# Altium footprint library ACTION_Others.pcblib: 88 footprints (part 4 of 6)
Each footprint in its own frame and in the unit in brackets; x right, y up, seen from the top. Pads: shape width x height; smd on the part's side, far side on the other; paste and mask are expansions set on the pad; w line width, h text height; cw(c..) or ccw(c..) is an arc to the next point about the centre after c.
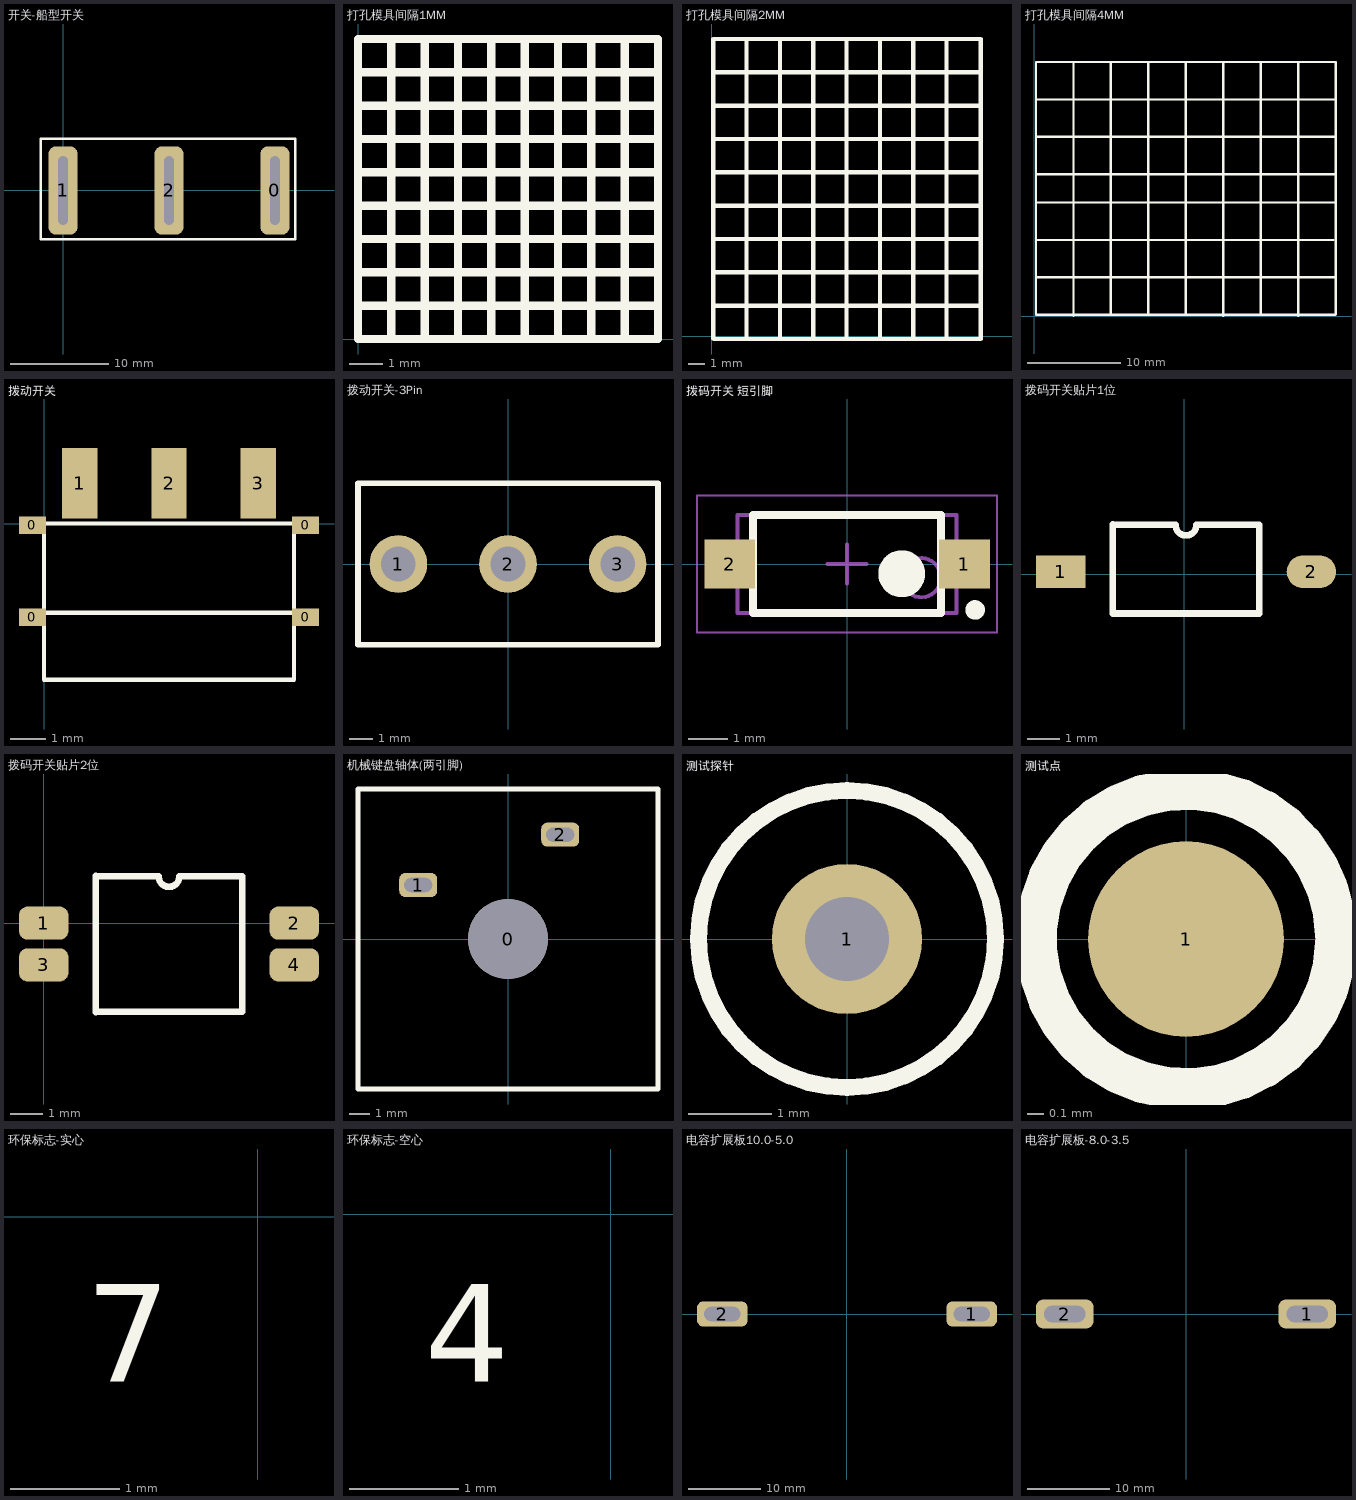
[diagram p3: the footprints below, top view; thin cyan lines are the x and y axes]

## 开关-船型开关 [mm]
pads (3):
  rrect50% 3x9 hole 7 slot 1 at 0 deg: 0(21.65,0) 1(0,0) 2(10.825,0)
Top Overlay:
  lines w0.254: -2.286,-5.004 23.714,-5.004 ; -2.286,-4.991 -2.286,5.309 ; -2.276,5.309 23.724,5.309 ; 23.724,-5.004 23.724,5.296

## 打孔模具间隔1MM [mm]
Top Overlay:
  lines w0.254: 0,1 9,1 ; 0,2 9,2 ; 0,3 9,3 ; 0,4 9,4 ; 0,5 9,5 ; 0,6 9,6 ; 0,7 9,7 ; 0,8 9,8 ; 1,0 1,9 ; 2,0 2,9 ; 3,0 3,9 ; 4,0 4,9 ; 5,0 5,9 ; 6,0 6,9 ; 7,0 7,9 ; 8,0 8,9 ; 0,0 9,0 9,9 0,9 0,0

## 打孔模具间隔2MM [mm]
Top Overlay:
  lines w0.254: 0.076,1.845 16.027,1.845 ; 0.076,3.845 16.104,3.845 ; 0.076,5.845 16.027,5.845 ; 0.076,7.845 16.002,7.845 ; 0.076,9.845 16.104,9.845 ; 0.076,11.845 16.078,11.845 ; 0.076,13.845 16.053,13.845 ; 0.076,15.845 16.053,15.845 ; 2.076,-0.076 2.076,17.845 ; 4.076,-0.127 4.076,17.845 ; 6.076,-0.076 6.076,17.845 ; 8.076,-0.076 8.076,17.845 ; 10.076,0 10.076,17.845 ; 12.076,-0.076 12.076,17.845 ; 14.076,-0.127 14.076,17.845 ; 0.076,-0.127 0.105,-0.155 16.129,-0.155 16.129,17.845 0.076,17.845 0.076,-0.127

## 打孔模具间隔4MM [mm]
Top Overlay:
  lines w0.254: 0.178,0.169 32.131,0.169 ; 0.178,0.178 0.178,27.169 32.055,27.169 ; 0.178,4.169 32.207,4.169 ; 0.178,8.169 31.902,8.169 ; 0.178,12.169 32.055,12.169 ; 0.178,15.169 32.055,15.169 ; 0.178,19.169 32.131,19.169 ; 0.178,23.169 32.131,23.169 ; 4.178,0.051 4.178,27.169 ; 8.178,0.305 8.178,27.169 ; 12.178,0.178 12.178,27.169 ; 16.178,0.406 16.178,27.169 ; 20.178,0.051 20.178,27.169 ; 24.178,0.229 24.178,27.169 ; 28.178,0.051 28.178,27.169 ; 32.178,0.229 32.178,27.169

## 拨动开关 [mil]
pads (7):
  rect 30x19.68 smd: 0(-13,-105) 0(-13,-2) 0(293,-105) 0(293,-2)
  rect 39.37x78.74 smd: 1(40,45) 2(140,45) 3(240,45)
Top Overlay:
  lines w4.92: 0,-98.43 0,0 279.53,0 ; 0.47,-100 280,-100 280,-1.57 ; 279.53,-100 0,-100 0,-175 280,-175 280,-101.57

## 拨动开关-3Pin [mm]
pads (3):
  round 2.5 hole 1.5: 1(-4.75,0) 2(0,0) 3(4.75,0)
Top Overlay:
  lines w0.254: -6.5,-3.5 6.5,-3.5 6.5,3.5 -6.5,3.5 -6.5,-3.5
3D body: height 6.4, standoff 0, extent -6.502,-3.505 6.502,3.48

## 拨码开关 短引脚 [mm]
pads (2):
  rect 1.3x1.25 smd: 1(3,0) 2(-3,0)
Top Overlay:
  circle w0.25: c3.275,-1.175 r0.125
  circle w0.6: c1.4,-0.25 r0.3
  lines w0.2: -2.4,-1.25 -2.4,1.25 2.4,1.25 2.4,-1.25 -2.4,-1.25
Mechanical 13:
  circle w0.1: c1.9,-0.35 r0.5
  lines w0.1: -2.8,-1.25 -2.8,1.25 2.8,1.25 2.8,-1.25 -2.8,-1.25
Mechanical 15:
  lines w0.05: -3.835,-1.75 -3.835,1.75 3.835,1.75 3.835,-1.75 -3.835,-1.75
  lines w0.1: -0.5,0 0.5,0 ; 0,-0.5 0,0.5
3D body: height 2.65, standoff 0.1, extent -2.8,-1.25 2.8,1.25

## 拨码开关贴片1位 [mm]
pads (2):
  rect 1.5x1 smd: 1(-3.759,0.076)
  oval 1.5x1 smd: 2(3.861,0.076)
Top Overlay:
  lines w0.2: -2.174,1.499 -0.267,1.499 ccw(c0.051,1.499) 0.368,1.499 2.276,1.499 2.276,-1.194 -2.174,-1.194 -2.174,1.511

## 拨码开关贴片2位 [mm]
pads (4):
  rrect50% 1.5x1 smd: 1(0,0) 2(7.62,0) 3(0,-1.27) 4(7.62,-1.27)
Top Overlay:
  lines w0.2: 1.585,-2.705 1.585,1.435 ; 1.585,-2.692 6.035,-2.692 6.035,1.422 4.127,1.422 cw(c3.81,1.422) 3.492,1.422 1.585,1.422
3D body "User Library-DHN-02F.STEP": height 1.6, standoff 0, extent 0.46,-2.535 7.16,1.265

## 机械键盘轴体(两引脚) [mm]
pads (3):
  round 4 hole 4: 0(0,0)
  rrect50% 1.9x1.2 hole 0.7 slot 1.4 at 0 deg: 1(-4.49,2.7) 2(2.61,5.22)
Top Overlay:
  lines w0.254: -7.5,-7.5 -7.5,7.5 7.5,7.5 7.5,-7.5 -7.5,-7.5
3D body "User Library-cherry mx.step": height 15.3, standoff -2.55, extent -8.223,-8.165 7.417,8.165

## 测试探针 [mm] "Keystone Compact loops"
height 5.588
pads (1):
  round 1.8 hole 1: 1(0,0)
Top Overlay:
  circle w0.203: c0,0 r1.778
Mechanical 5:
  circle w0.127: c0,0 r1.796
3D body "Keystone_5006.stp": height 5.72, standoff -3.3, extent -1.613,-1.603 1.587,1.596

## 测试点 [mm]
pads (1):
  round 1.2 smd: 1(0,0)
Top Overlay:
  circle w0.254: c0,0 r0.92

## 环保标志-实心 [mm]
Top Overlay:
  text "7" at -1.575,-1.803 h1.52

## 环保标志-空心 [mm]
Top Overlay:
  text "4" at -1.702,-1.829 h1.52

## 电容扩展板10.0-5.0 [mm] "10.0-5.0"
pads (2):
  rrect50% 7x3.5 hole 2 slot 5 at 0 deg: 1(17.25,0) 2(-17.25,0)
3D body "电容扩展板.step": height 13.33, standoff -3, extent -19.248,-12.896 22.099,3.607

## 电容扩展板-8.0-3.5 [mm]
pads (2):
  rrect50% 7x3.5 hole 2 slot 5 at 0 deg: 1(14.75,0) 2(-14.75,0)
3D body "电容扩展板.step": height 10.34, standoff -5, extent -17.22,-12.734 16.75,2.868